# Altium footprint library Components.PcbLib: 139 footprints (part 5 of 9)
Each footprint in its own frame and in the unit in brackets; x right, y up, seen from the top. Pads: shape width x height; smd on the part's side, far side on the other; paste and mask are expansions set on the pad; w line width, h text height; cw(c..) or ccw(c..) is an arc to the next point about the centre after c.
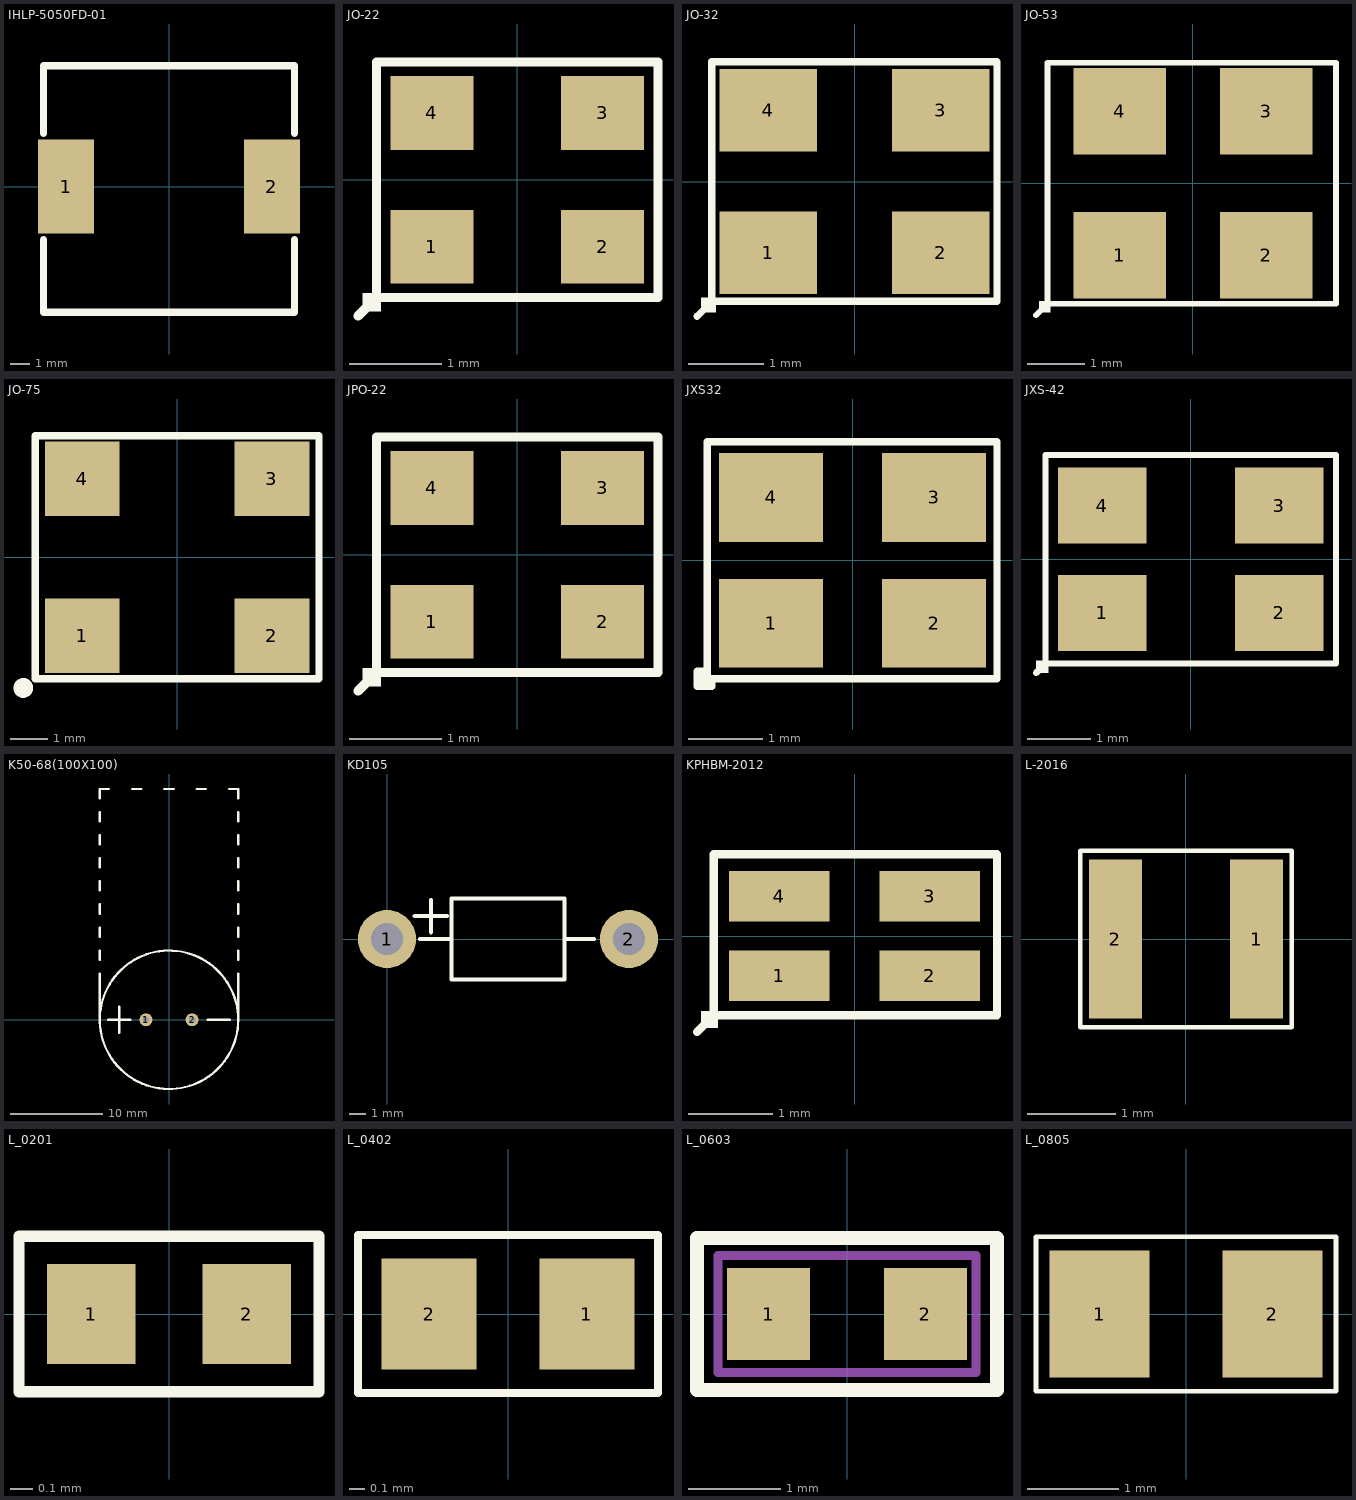
[diagram p4: the footprints below, top view; thin cyan lines are the x and y axes]

## IHLP-5050FD-01 [mil]
pads (2):
  rect 116x195 smd paste-5.91: 1(-213,0) 2(213,0)
Top Overlay:
  lines w15: -260,-110 -260,-260 260,-260 260,-110 ; -260,110 -260,250 260,250 260,110
3D body "IHLP-5050FD.STEP": height 271.65, standoff -0.39, extent -272.05,-257.87 272.05,246.06

## JO-22 [mm]
pads (4):
  rect 0.9x0.8 smd paste-0.05 mask+0.08: 1(-0.925,-0.725) 2(0.925,-0.725) 3(0.925,0.725) 4(-0.925,0.725)
Top Overlay:
  rectangle: -1.675,-1.425 -1.475,-1.225
  lines w0.1: -1.725,-1.475 -1.525,-1.275 ; -1.525,-1.275 1.525,-1.275 1.525,1.275 -1.525,1.275 -1.525,-1.275
3D body: height 0.8, standoff 0, extent -1.524,-1.274 1.524,1.274

## JO-32 [mm]
pads (4):
  rect 1.3x1.1 smd paste-0.1: 1(-1.15,-0.95) 2(1.15,-0.95) 3(1.15,0.95) 4(-1.15,0.95)
Top Overlay:
  rectangle: -2.05,-1.75 -1.85,-1.55
  lines w0.1: -2.1,-1.8 -1.9,-1.6 ; -1.9,-1.6 -1.75,-1.6 1.9,-1.6 1.9,1.6 -1.9,1.6 -1.9,-1.6
3D body: height 1.05, standoff 0, extent -1.899,-1.599 1.899,1.599

## JO-53 [mm]
pads (4):
  rect 1.6x1.5 smd paste-0.18: 1(-1.27,-1.25) 2(1.27,-1.25) 3(1.27,1.25) 4(-1.27,1.25)
Top Overlay:
  rectangle: -2.67,-2.24 -2.47,-2.04
  lines w0.1: -2.72,-2.29 -2.52,-2.09 ; -2.52,-2.09 -2.37,-2.09 2.48,-2.09 2.48,2.09 -2.52,2.09 -2.52,-2.09
3D body: height 1.4, standoff 0, extent -2.519,-2.089 2.479,2.089

## JO-75 [mm]
pads (4):
  rect 2x2 smd paste-0.18 mask+0.05: 1(-2.54,-2.1) 2(2.54,-2.1) 3(2.54,2.1) 4(-2.54,2.1)
Top Overlay:
  circle w0.3: c-4.115,-3.5 r0.115
  lines w0.2: -3.8,-3.25 -3.8,3.25 3.8,3.25 3.8,-3.25 -3.8,-3.25
3D body "User Library-JO75.STEP": height 1.6, standoff 0, extent -3.5,-2.5 3.5,2.5

## JPO-22 [mm]
pads (4):
  rect 0.9x0.8 smd paste-0.05 mask+0.08: 1(-0.925,-0.725) 2(0.925,-0.725) 3(0.925,0.725) 4(-0.925,0.725)
Top Overlay:
  rectangle: -1.675,-1.425 -1.475,-1.225
  lines w0.1: -1.725,-1.475 -1.525,-1.275 ; -1.525,-1.275 -1.525,1.275 1.525,1.275 1.525,-1.275 -1.525,-1.275
3D body: height 0.8, standoff 0, extent -1.524,-1.274 1.524,1.274

## JXS32 [mm]
pads (4):
  rect 1.4x1.2 smd paste-0.1 mask+0.08: 1(-1.1,-0.85) 2(1.1,-0.85) 3(1.1,0.85) 4(-1.1,0.85)
Top Overlay:
  lines w0.1: -2,-1.7 -2,-1.5 ; -1.96,-1.5 -2.1,-1.5 -2.1,-1.7 -1.9,-1.7 -1.9,-1.6 ; -0.425,-1.6 1.95,-1.6 1.95,1.6 -1.96,1.6 -1.96,-1.6 0.425,-1.6
3D body "SW3dPS-JXS32.STEP": height 0.75, standoff 0, extent -1.575,-1.225 1.625,1.275

## JXS-42 [mm]
pads (4):
  rect 1.4x1.2 smd paste-0.05 mask+0.08: 1(-1.4,-0.85) 2(1.4,-0.85) 3(1.4,0.85) 4(-1.4,0.85)
Top Overlay:
  rectangle: -2.45,-1.8 -2.25,-1.6
  lines w0.1: -2.45,-1.8 -2.3,-1.65 ; -2.3,-1.65 2.3,-1.65 2.3,1.65 -2.3,1.65 -2.3,-1.65

## K50-68(100X100) [mm]
pads (2):
  round 1.4 hole 0.7: 1(-2.5,0) 2(2.5,0)
Top Overlay:
  circle w0.25: c0,0 r7.5
  lines w0.254: -7.5,0 -7.5,5 ; -7.5,6.5 -7.5,7.5 ; -7.5,9 -7.5,10 ; -7.5,11.5 -7.5,12.5 ; -7.5,14 -7.5,15 ; -7.5,16.5 -7.5,17.5 ; -7.5,19 -7.5,20 ; -7.5,21.5 -7.5,22.5 ; -7.5,24 -7.5,25 -6.5,25 ; -6.6,0 -4.2,0 ; -5.4,-1.4 -5.4,1.4 ; -4,25 -3,25 ; -0.5,25 0.5,25 ; 3,25 4,25 ; 4.2,0 6.6,0 ; 6.5,25 7.5,25 7.5,24 ; 7.5,0 7.5,5 ; 7.5,6.5 7.5,7.5 ; 7.5,9 7.5,10 ; 7.5,11.5 7.5,12.5 ; 7.5,14 7.5,15 ; 7.5,16.5 7.5,17.5 ; 7.5,19 7.5,20 ; 7.5,21.5 7.5,22.5

## KD105 [mm]
pads (2):
  round 3.6 hole 2: 1(0,0) 2(15,0)
Top Overlay:
  lines w0.254: 1.72,1.42 3.72,1.42 ; 2.05,0 4,0 ; 2.72,0.42 2.72,2.42 ; 11,0 12.84,0 ; 4,-2.5 4,2.5 11,2.5 11,-2.5 4,-2.5

## KPHBM-2012 [mm]
pads (4):
  rect 1.2x0.6 smd paste-0.06 mask+0.06: 1(-0.9,-0.475) 2(0.9,-0.475) 3(0.9,0.475) 4(-0.9,0.475)
Top Overlay:
  rectangle: -1.83,-1.095 -1.63,-0.895
  lines w0.1: -1.88,-1.145 -1.68,-0.945 ; -1.68,-0.945 -1.53,-0.945 1.7,-0.945 1.7,0.975 -1.68,0.975 -1.68,-0.945
3D body: height 0.45, standoff 0, extent -1.679,-0.944 1.699,0.974

## L-2016 [mm]
pads (2):
  rect 0.6x1.8 smd paste-0.06 mask+0.05: 1(0.8,0) 2(-0.8,0)
Top Overlay:
  lines w0.05: -1.2,-1 -1.2,1 1.2,1 1.2,-1 -1.2,-1
3D body "User Library-V0805HD.STEP": height 1.2, standoff 0, extent -1,-0.625 1,0.625

## L_0201 [mm]
pads (2):
  rect 0.4x0.45 smd paste-0.03 mask+0.03: 1(-0.35,0) 2(0.35,0)
Top Overlay:
  lines w0.05: -0.675,-0.35 -0.675,0.35 0.675,0.35 0.675,-0.35 -0.675,-0.35
Mechanical 9:
  lines w0.05: -0.35,-0.2 -0.35,0.2 ; 0.35,-0.2 0.35,0.2
3D body "User Library-V0201HD.STEP": height 0.3, standoff 0, extent -0.3,-0.15 0.3,0.15

## L_0402 [mm]
pads (2):
  rect 0.6x0.7 smd paste-0.06 mask+0.05: 1(0.5,0) 2(-0.5,0)
Top Overlay:
  lines w0.05: -0.95,-0.5 0.95,-0.5 0.95,0.5 -0.95,0.5 -0.95,-0.5
3D body "User Library-V0402HD.STEP": height 0.6, standoff 0, extent -0.5,-0.25 0.5,0.25

## L_0603 [mm]
pads (2):
  rect 0.9x1 smd paste-0.08 mask+0.05: 1(-0.85,0) 2(0.85,0)
Top Overlay:
  lines w0.15: -1.625,-0.825 1.625,-0.825 1.625,0.825 -1.625,0.825 -1.625,-0.825
Mechanical 29:
  lines w0.1: -1.397,-0.635 -1.397,0.635 1.397,0.635 1.397,-0.635 -1.397,-0.635
  text ".Designator" at -1.27,-0.381 h0.8
3D body "User Library-V0603HD.STEP": height 0.9, standoff 0, extent -0.8,-0.4 0.8,0.4

## L_0805 [mm]
pads (2):
  rect 1.1x1.4 smd paste-0.1 mask+0.05: 1(-0.95,0) 2(0.95,0)
Top Overlay:
  lines w0.05: -1.65,-0.85 1.65,-0.85 1.65,0.85 -1.65,0.85 -1.65,-0.85
3D body "User Library-ind_0805.STEP": height 0.95, standoff 0, extent -1,-0.6 1,0.6